# Altium footprint library WR-WTB.PcbLib: 242 footprints (part 16 of 16)
Each footprint in its own frame and in the unit in brackets; x right, y up, seen from the top. Pads: shape width x height; smd on the part's side, far side on the other; paste and mask are expansions set on the pad; w line width, h text height; cw(c..) or ccw(c..) is an arc to the next point about the centre after c.
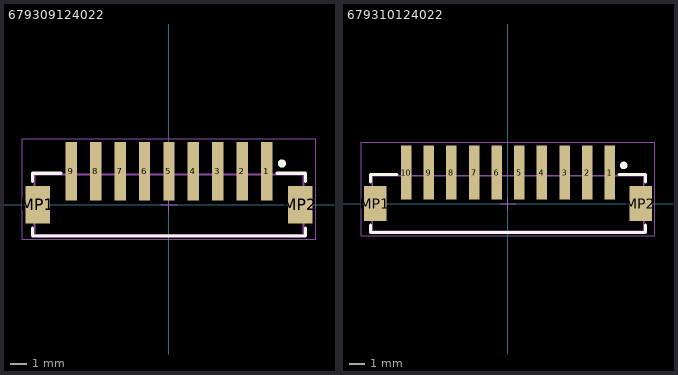
[diagram p15: the footprints below, top view; thin cyan lines are the x and y axes]

## 679309124022 [mm] "1.50mm SMT Male Vertical Shrouded Header, 9p"
height 5
pads (11):
  rect 0.7x3.6 smd: 1(6,2.05) 2(4.5,2.05) 3(3,2.05) 4(1.5,2.05) 5(0,2.05) 6(-1.5,2.05) 7(-3,2.05) 8(-4.5,2.05) 9(-6,2.05)
  rect 1.5x2.3 smd: MP1(-8.05,0) MP2(8.05,0)
Top Overlay:
  circle w0.25: c6.925,2.525 r0.125
  lines w0.2: -8.375,-1.425 -8.375,-1.925 8.375,-1.925 8.375,-1.425 ; -8.375,1.425 -8.375,1.925 -6.625,1.925 ; 6.625,1.925 8.375,1.925 8.375,1.425
Top Designator:
  text ".Designator" at -7.498,-0.5 h1.5
Top Component Outline:
  lines w0.1: -8.25,-1.85 8.25,-1.85 8.25,1.85 -8.25,1.85 -8.25,-1.85
Top Courtyard:
  lines w0.05: -0.5,0 0.5,0 ; 0,-0.5 0,0.5 ; -9,-2.125 9,-2.125 9,4.05 -9,4.05 -9,-2.125
3D body "679309124022.stp": height 5.49, standoff -0.01, extent -8.25,-1.85 8.25,3.35

## 679310124022 [mm] "1.50mm SMT Male Vertical Shrouded Header, 10p"
height 5
pads (12):
  rect 0.7x3.6 smd: 1(6.75,2.05) 2(5.25,2.05) 3(3.75,2.05) 4(2.25,2.05) 5(0.75,2.05) 6(-0.75,2.05) 7(-2.25,2.05) 8(-3.75,2.05) 9(-5.25,2.05) 10(-6.75,2.05)
  rect 1.5x2.3 smd: MP1(-8.8,0) MP2(8.8,0)
Top Overlay:
  circle w0.25: c7.675,2.525 r0.125
  lines w0.2: -9.125,-1.425 -9.125,-1.925 9.125,-1.925 9.125,-1.425 ; -9.125,1.425 -9.125,1.925 -7.375,1.925 ; 7.375,1.925 9.125,1.925 9.125,1.425
Top Designator:
  text ".Designator" at -7.498,-0.5 h1.5
Top Component Outline:
  lines w0.1: -9,-1.85 -9,1.85 9,1.85 9,-1.85 -9,-1.85
Top Courtyard:
  lines w0.05: -0.5,0 0.5,0 ; 0,-0.5 0,0.5 ; -9.75,-2.125 9.75,-2.125 9.75,4.05 -9.75,4.05 -9.75,-2.125
3D body "679310124022.stp": height 5.49, standoff -0.01, extent -9,-1.85 9,3.35